# Altium footprint library mylib.PcbLib: 82 footprints (part 3 of 6)
Each footprint in its own frame and in the unit in brackets; x right, y up, seen from the top. Pads: shape width x height; smd on the part's side, far side on the other; paste and mask are expansions set on the pad; w line width, h text height; cw(c..) or ccw(c..) is an arc to the next point about the centre after c.
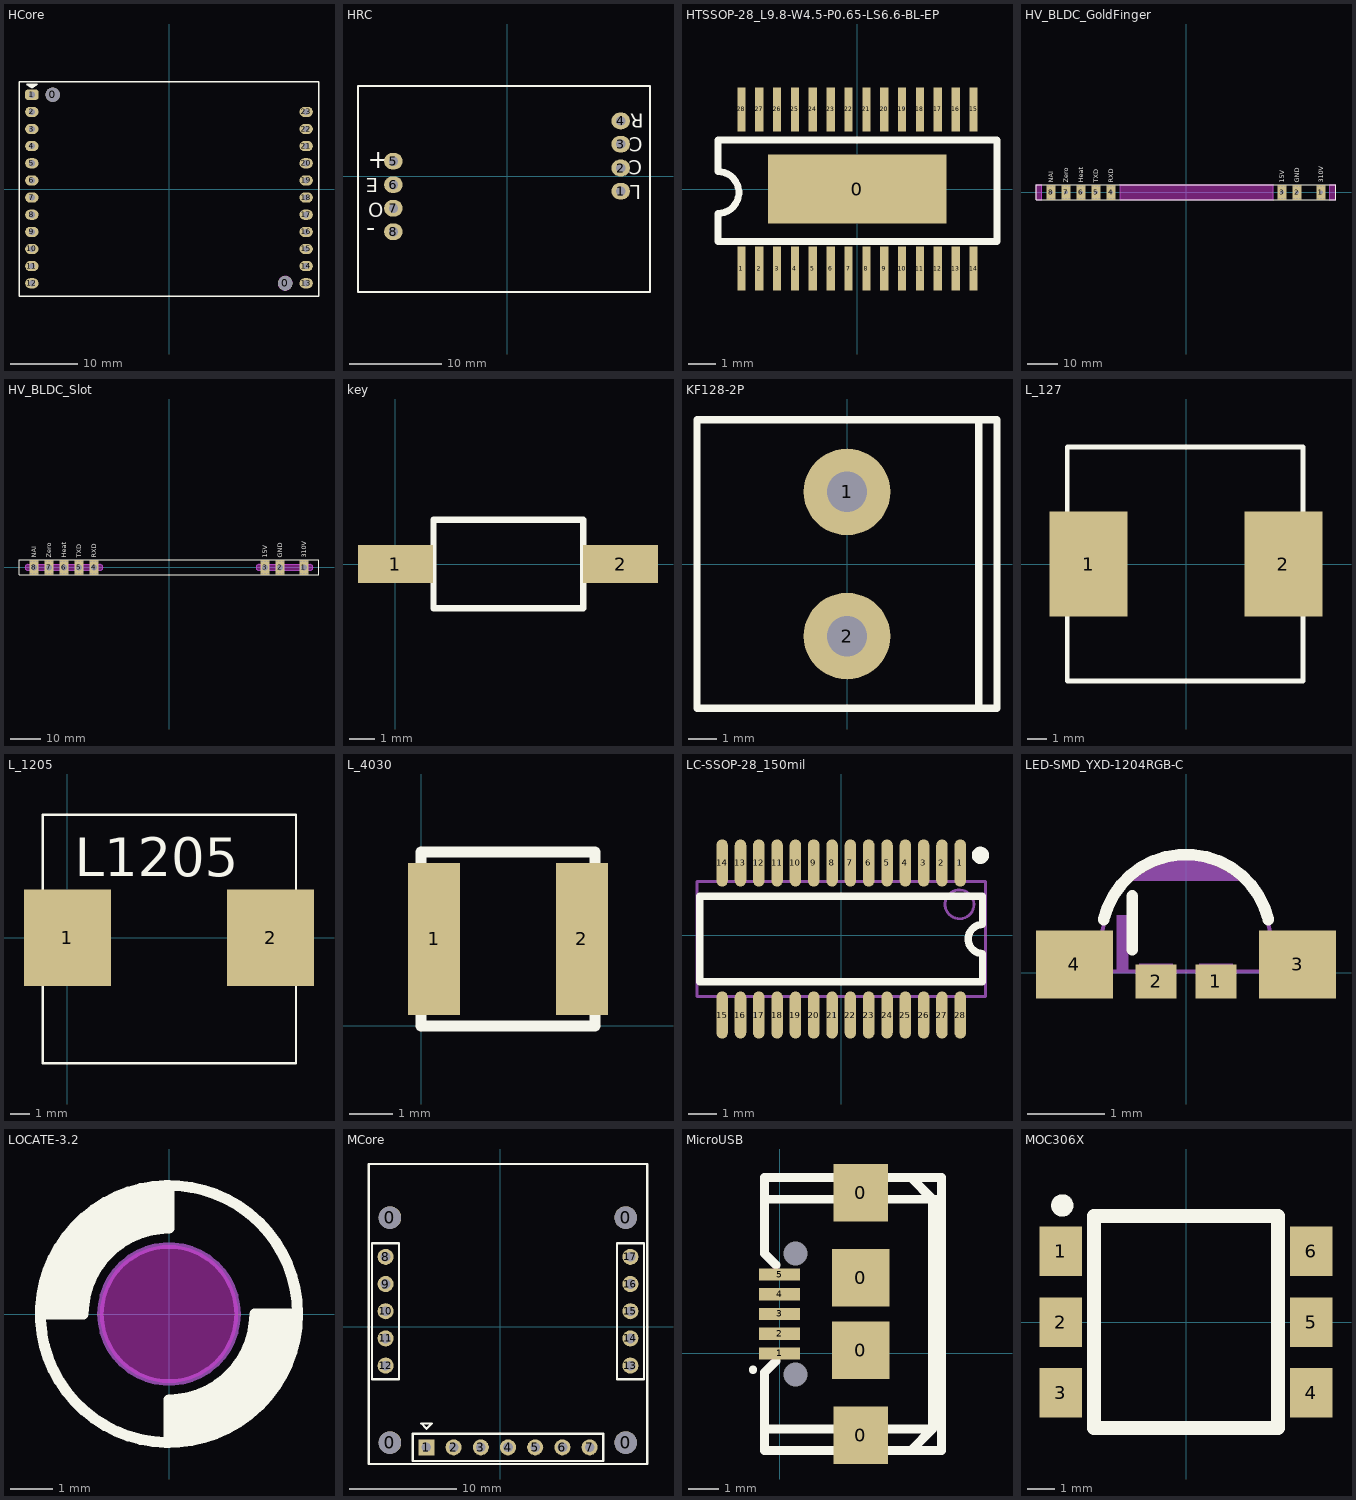
[diagram p2: the footprints below, top view; thin cyan lines are the x and y axes]

## HCore [mm]
pads (25):
  round 2.1 hole 2.1: 0(-17.225,13.97) 0(17.225,-13.97)
  rrect50% 2x1.5 hole 0.9: 1(-20.32,13.97)
  oval 2x1.5 hole 0.9: 2(-20.32,11.43) 3(-20.32,8.89) 4(-20.32,6.35) 5(-20.32,3.81) 6(-20.32,1.27) 7(-20.32,-1.27) 8(-20.32,-3.81) 9(-20.32,-6.35) 10(-20.32,-8.89) 11(-20.32,-11.43) 12(-20.32,-13.97) 13(20.32,-13.97) 14(20.32,-11.43) 15(20.32,-8.89) 16(20.32,-6.35) 17(20.32,-3.81) 18(20.32,-1.27) 19(20.32,1.27) 20(20.32,3.81) 21(20.32,6.35) 22(20.32,8.89) 23(20.32,11.43)
Top Overlay:
  region: -21.082,15.494 -19.558,15.494 -20.32,14.986
  lines w0.2: -22.225,-15.875 -22.225,15.875 22.225,15.875 22.225,-15.875 -22.225,-15.875 ; -21.082,15.494 -20.32,14.986 -19.558,15.494 -21.082,15.494
Keep-Out Layer:
  circle w0.1: c17.225,-13.97 r1.05

## HRC [mm]
pads (8):
  oval 2x1.8 hole 1: 1(12.267,-1.6) 2(12.267,0.9) 3(12.267,3.48) 4(12.267,5.98) 5(-12.267,1.64) 6(-12.267,-0.9) 7(-12.267,-3.44) 8(-12.267,-5.98)
Top Overlay:
  lines w0.2: -16.087,-12.491 -16.087,9.759 15.413,9.759 15.413,-12.491 -16.087,-12.491
  text "R" at 14.763,6.774 h1.52
  text "C" at 14.638,4.224 h1.52
  text "C" at 14.613,1.724 h1.52
  text "L" at 14.488,-0.976 h1.52
  text "+" at -15.027,2.587 h2
  text "E" at -13.887,-0.226 h1.52
  text "O" at -14.987,-2.876 h1.52
  text "-" at -15.211,-4.966 h2

## HTSSOP-28_L9.8-W4.5-P0.65-LS6.6-BL-EP [mm]
pads (29):
  rect 6.5x2.5 smd: 0(0,0)
  rect 0.3x1.6 smd: 1(-4.225,-2.9) 2(-3.575,-2.9) 3(-2.925,-2.9) 4(-2.275,-2.9) 5(-1.625,-2.9) 6(-0.975,-2.9) 7(-0.325,-2.9) 8(0.325,-2.9) 9(0.975,-2.9) 10(1.625,-2.9) 11(2.275,-2.9) 12(2.925,-2.9) 13(3.575,-2.9) 14(4.225,-2.9) 15(4.225,2.9) 16(3.575,2.9) 17(2.925,2.9) 18(2.275,2.9) 19(1.625,2.9) 20(0.975,2.9) 21(0.325,2.9) 22(-0.325,2.9) 23(-0.975,2.9) 24(-1.625,2.9) 25(-2.275,2.9) 26(-2.925,2.9) 27(-3.575,2.9) 28(-4.225,2.9)
Top Overlay:
  lines w0.254: -5.08,-1.905 5.08,-1.905 5.08,1.778 -5.08,1.778 -5.08,0.635 cw(c-5.08,-0.127) -5.08,-0.889 -5.08,-1.905

## HV_BLDC_GoldFinger [mm]
pads (8):
  rect 3x5 hole 1.2: 1(45,0) 2(37,0) 3(32,0) 4(-25,0) 5(-30,0) 6(-35,0) 7(-40,0) 8(-45,0)
via -46,-2 diameter 0.5 hole 0.3
via -45,-2 diameter 0.5 hole 0.3
via -44,-2 diameter 0.5 hole 0.3
via -44,2 diameter 0.5 hole 0.3
via -45,2 diameter 0.5 hole 0.3
via -46,2 diameter 0.5 hole 0.3
via -41,-2 diameter 0.5 hole 0.3
via -40,-2 diameter 0.5 hole 0.3
via -39,-2 diameter 0.5 hole 0.3
via -39,2 diameter 0.5 hole 0.3
via -40,2 diameter 0.5 hole 0.3
via -41,2 diameter 0.5 hole 0.3
via -36,-2 diameter 0.5 hole 0.3
via -35,-2 diameter 0.5 hole 0.3
via -34,-2 diameter 0.5 hole 0.3
via -34,2 diameter 0.5 hole 0.3
via -35,2 diameter 0.5 hole 0.3
via -36,2 diameter 0.5 hole 0.3
via -31,-2 diameter 0.5 hole 0.3
via -30,-2 diameter 0.5 hole 0.3
via -29,-2 diameter 0.5 hole 0.3
via -29,2 diameter 0.5 hole 0.3
via -30,2 diameter 0.5 hole 0.3
via -31,2 diameter 0.5 hole 0.3
via -26,-2 diameter 0.5 hole 0.3
via -25,-2 diameter 0.5 hole 0.3
via -24,-2 diameter 0.5 hole 0.3
via -24,2 diameter 0.5 hole 0.3
via -25,2 diameter 0.5 hole 0.3
via -26,2 diameter 0.5 hole 0.3
via 31,-2 diameter 0.5 hole 0.3
via 32,-2 diameter 0.5 hole 0.3
via 33,-2 diameter 0.5 hole 0.3
via 33,2 diameter 0.5 hole 0.3
via 32,2 diameter 0.5 hole 0.3
via 31,2 diameter 0.5 hole 0.3
via 36,-2 diameter 0.5 hole 0.3
via 37,-2 diameter 0.5 hole 0.3
via 38,-2 diameter 0.5 hole 0.3
via 38,2 diameter 0.5 hole 0.3
via 37,2 diameter 0.5 hole 0.3
via 36,2 diameter 0.5 hole 0.3
via 44,-2 diameter 0.5 hole 0.3
via 45,-2 diameter 0.5 hole 0.3
via 46,-2 diameter 0.5 hole 0.3
via 46,2 diameter 0.5 hole 0.3
via 45,2 diameter 0.5 hole 0.3
via 44,2 diameter 0.5 hole 0.3
Top Overlay:
  lines w0.254: -50,2.5 50,2.5 50,-2.5 -50,-2.5 -50,2.5
  text "310V" at 45.746,3.254 h1.52
  text "TXD" at -29.254,3.254 h1.52
  text "NAI" at -44.254,3.254 h1.52
  text "Heat" at -34.254,3.254 h1.52
  text "Zero" at -39.254,3.254 h1.52
  text "RXD" at -24.254,3.254 h1.52
  text "15V" at 32.746,3.254 h1.52
  text "GND" at 37.746,3.254 h1.52
Keep-Out Layer:
  board cut-out: 48,-2.5 48,2.5 50,2.5 50,-2.5
  board cut-out: -22,-2.5 29,-2.5 29,2.5 -22,2.5
  board cut-out: -50,-2.5 -48,-2.5 -48,2.5 -50,2.5
Mechanical 1:
  lines w0.1: -50,-2.5 -48,-2.5 -48,2.5 -50,2.5 -50,-2.5 ; -22,-2.5 29,-2.5 29,2.5 -22,2.5 -22,-2.5 ; 48,-2.5 50,-2.5 50,2.5 48,2.5 48,-2.5

## HV_BLDC_Slot [mm]
pads (56):
  round 0.5 hole 0.3: 1(44,-2) 1(44,2) 1(45,-2) 1(45,2) 1(46,-2) 1(46,2) 2(36,-2) 2(36,2) 2(37,-2) 2(37,2) 2(38,-2) 2(38,2) 3(31,-2) 3(31,2) 3(32,-2) 3(32,2) 3(33,-2) 3(33,2) 4(-26,-2) 4(-26,2) 4(-25,-2) 4(-25,2) 4(-24,-2) 4(-24,2) 5(-31,-2) 5(-31,2) 5(-30,-2) 5(-30,2) 5(-29,-2) 5(-29,2) 6(-36,-2) 6(-36,2) 6(-35,-2) 6(-35,2) 6(-34,-2) 6(-34,2) 7(-41,-2) 7(-41,2) 7(-40,-2) 7(-40,2) 7(-39,-2) 7(-39,2) 8(-46,-2) 8(-46,2) 8(-45,-2) 8(-45,2) 8(-44,-2) 8(-44,2)
  rect 3x5 hole 2 square: 1(45,0) 2(37,0) 3(32,0) 4(-25,0) 5(-30,0) 6(-35,0) 7(-40,0) 8(-45,0)
Top Overlay:
  lines w0.254: -50,2.5 50,2.5 50,-2.5 -50,-2.5 -50,2.5
  text "GND" at 37.746,3.254 h1.52
  text "RXD" at -24.254,3.254 h1.52
  text "Zero" at -39.254,3.254 h1.52
  text "Heat" at -34.254,3.254 h1.52
  text "NAI" at -44.254,3.254 h1.52
  text "TXD" at -29.254,3.254 h1.52
  text "310V" at 45.746,3.254 h1.52
  text "15V" at 32.746,3.254 h1.52
Keep-Out Layer:
  board cut-out: -47,-1 -23,-1 -22.868,-1 -22.614,-0.932 -22.386,-0.8 -22.2,-0.614 -22.068,-0.386 -22,-0.132 -22,0.132 -22.068,0.386 -22.2,0.614 -22.386,0.8 -22.614,0.932 -22.868,1 -23,1 -47,1 -47.132,1 -47.386,0.932 -47.614,0.8 -47.8,0.614 -47.932,0.386 -48,0.132 -48,-0.132 -47.932,-0.386 -47.8,-0.614 -47.614,-0.8 -47.386,-0.932 -47.132,-1
  board cut-out: 30,-1 47,-1 47.132,-1 47.386,-0.932 47.614,-0.8 47.8,-0.614 47.932,-0.386 48,-0.132 48,0.132 47.932,0.386 47.8,0.614 47.614,0.8 47.386,0.932 47.132,1 47,1 30,1 29.868,1 29.614,0.932 29.386,0.8 29.2,0.614 29.068,0.386 29,0.132 29,-0.132 29.068,-0.386 29.2,-0.614 29.386,-0.8 29.614,-0.932 29.868,-1
Mechanical 1:
  lines w0.1: -47,-1 cw(c-47,0) -47,1 -23,1 cw(c-23,0) -23,-1 -47,-1 ; 30,-1 cw(c30,0) 30,1 47,1 cw(c47,0) 47,-1 30,-1
3D body: height 25, standoff 0, extent -65,-2 65,2

## key [mil]
height 196.85
pads (2):
  rect 118.11x60 smd: 1(0,0) 2(355,0)
Top Overlay:
  lines w10: 60,-70 60,70 296.22,70 296.22,-70 60,-70

## KF128-2P [mm]
pads (2):
  round 3 hole 1.4: 1(0,2.5) 2(0,-2.5)
Top Overlay:
  lines w0.254: 4.572,-4.953 4.572,4.953 ; -5.2,-5 5.2,-5 5.2,5 -5.2,5 -5.2,-5

## L_127 [mm]
pads (2):
  rect 4x5.4 smd: 1(-5,0) 2(5,0)
Top Overlay:
  lines w0.254: -6.096,-6 6,-6 6,6 -6.096,6 -6.096,-6

## L_1205 [mm]
height 5
pads (2):
  rect 4.5x5 smd: 1(0,0) 2(10.5,0)
Top Overlay:
  lines w0.127: -1.27,-6.477 11.811,-6.477 11.811,6.35 -1.27,6.35 -1.27,-6.4
  text "L1205" at 0.381,3.175 h2
3D body: height 5, standoff 0.1, extent -1.27,-6.477 11.811,6.35

## L_4030 [mm]
pads (2):
  rect 1.2x3.5 smd: 1(0.3,2) 2(3.7,2)
Top Overlay:
  lines w0.254: 0,0 4,0 4,4 0,4 0,0

## LC-SSOP-28_150mil [mm]
height 1
pads (28):
  oval 0.4x1.63 smd mask+0.051: 1(4.127,2.508) 2(3.492,2.508) 3(2.857,2.508) 4(2.222,2.508) 5(1.587,2.508) 6(0.953,2.508) 7(0.318,2.508) 8(-0.318,2.508) 9(-0.953,2.508) 10(-1.587,2.508) 11(-2.222,2.508) 12(-2.857,2.508) 13(-3.492,2.508) 14(-4.127,2.508) 15(-4.127,-2.762) 16(-3.492,-2.762) 17(-2.857,-2.762) 18(-2.222,-2.762) 19(-1.587,-2.762) 20(-0.953,-2.762) 21(-0.318,-2.762) 22(0.318,-2.762) 23(0.953,-2.762) 24(1.587,-2.762) 25(2.222,-2.762) 26(2.857,-2.762) 27(3.492,-2.762) 28(4.127,-2.762)
Top Overlay:
  circle w0.3: c4.825,2.773 r0.15
  lines w0.254: -4.9,-1.607 -4.9,1.353 4.9,1.353 4.9,0.373 ccw(c4.9,-0.127) 4.9,-0.627 4.9,-1.607 -4.9,-1.607
Mechanical 13:
  circle w0.1: c4.1,1.073 r0.5
  lines w0.1: -5,-2.127 -5,1.873 5,1.873 5,-2.127 -5,-2.127
3D body: height 0.25, standoff 0, extent -5.08,-2.159 5.08,1.905

## LED-SMD_YXD-1204RGB-C [mm]
pads (4):
  rect 0.53x0.44 smd paste+0 mask+0.05: 1(0.39,-0.11) 2(-0.39,-0.11)
  rect 1x0.88 smd paste+0 mask+0.05: 3(1.45,0.11) 4(-1.45,0.11)
Top Overlay:
  lines w0.152: -1.071,0.693 cw(c0,0.441) 1.071,0.693 ; -0.7,0.3 -0.7,1
Mechanical 6:
  region: 0.7,1.2 0.683,1.217 0.616,1.284 0.457,1.39 0.282,1.463 0.095,1.5 0,1.5 -0.095,1.5 -0.282,1.463 -0.457,1.39 -0.616,1.284 -0.683,1.217 -0.7,1.2
  region: 0.255,-0.15 0.605,-0.15 0.605,-0.25 0.255,-0.25
  region: -0.525,-0.15 -0.175,-0.15 -0.175,-0.25 -0.525,-0.25
  region: 1.2,0.1 1.85,0.1 1.85,-0.05 1.2,-0.05
  region: 1.45,-0.3 1.45,0.35 1.6,0.35 1.6,-0.3
  region: -1.875,0.025 -1.225,0.025 -1.225,-0.125 -1.875,-0.125
  region: -0.9,0.75 -0.9,0 -0.75,0 -0.75,0.75
Mechanical 15:
  region: 0.175,0.12 0.605,0.12 0.605,0.02 0.175,0.02
  region: -0.605,0.12 -0.175,0.12 -0.175,0.02 -0.605,0.02
  region: 1,0.5 1.6,0.5 1.6,0.02 1,0.02
  region: -1.6,0.5 -1,0.5 -1,0.02 -1.6,0.02
  region: 1.66,0.02 1.66,0.045 1.625,0.08 1.575,0.08 1.54,0.045 1.54,0.02 1.54,-0.005 1.575,-0.04 1.625,-0.04 1.66,-0.005
  lines w0.051: -1.6,0.02 -1.6,0.5 -1.1,0.5 -1.01,0.87 -0.84,1.15 -0.63,1.33 -0.41,1.47 -0.16,1.52 0,1.52 0.24,1.51 0.49,1.42 0.72,1.27 0.89,1.09 1.02,0.88 1.1,0.5 1.6,0.5 1.6,0.02 -1.6,0.02
3D body "3D_PCB1_2023-10-13.step": height 2.61, standoff 1.6, extent -1.6,-0.325 1.6,1.176

## LOCATE-3.2 [mm]
Top Overlay:
  circle w0.254: c0,0 r3
  lines w0.254: -3,0 -2,0 cw(c0,0) 0,2 0,3 ; -2.8,0 cw(c0,0) 0,2.8 ; -2.6,0 cw(c0,0) 0,2.6 ; -2.4,0 cw(c0,0) 0,2.4 ; -2.2,0 cw(c0,0) 0,2.2 ; 0,-3.002 0,-2 ccw(c0,0) 2,0 3,0 ; 0,-2.8 ccw(c0,0) 2.8,0 ; 0,-2.6 ccw(c0,0) 2.6,0 ; 0,-2.4 ccw(c0,0) 2.4,0 ; 0,-2.2 ccw(c0,0) 2.2,0
Keep-Out Layer:
  board cut-out: -1.6,0 -1.6,-0.158 -1.538,-0.467 -1.418,-0.758 -1.243,-1.02 -1.02,-1.243 -0.758,-1.418 -0.467,-1.538 -0.158,-1.6 0,-1.6 0.158,-1.6 0.467,-1.538 0.758,-1.418 1.02,-1.243 1.243,-1.02 1.418,-0.758 1.538,-0.467 1.6,-0.158 1.6,0 1.6,0.158 1.539,0.467 1.418,0.758 1.243,1.02 1.02,1.243 0.758,1.418 0.467,1.539 0.158,1.6 0,1.6 -0.158,1.6 -0.467,1.538 -0.758,1.418 -1.02,1.243 -1.243,1.02 -1.418,0.758 -1.538,0.467 -1.6,0.158
Mechanical 1:
  circle w0.152: c0,0 r1.6
Multi-Layer:
  pour cut-out: 0,-3.5 0.229,-3.5 0.684,-3.44 1.127,-3.321 1.551,-3.146 1.949,-2.916 2.313,-2.637 2.637,-2.313 2.916,-1.949 3.146,-1.551 3.321,-1.127 3.44,-0.684 3.5,-0.229 3.5,0 3.5,0.229 3.44,0.684 3.321,1.127 3.146,1.551 2.916,1.949 2.637,2.313 2.313,2.637 1.949,2.916 1.551,3.146 1.127,3.321 0.684,3.44 0.229,3.5 0,3.5 -0.229,3.5 -0.684,3.44 -1.127,3.321 -1.551,3.146 -1.949,2.916 -2.313,2.637 -2.637,2.313 -2.916,1.949 -3.146,1.551 -3.321,1.127 -3.44,0.684 -3.5,0.229 -3.5,0 -3.5,-0.229 -3.44,-0.684 -3.321,-1.127 -3.146,-1.551 -2.916,-1.949 -2.637,-2.313 -2.313,-2.637 -1.949,-2.916 -1.551,-3.146 -1.127,-3.321 -0.684,-3.44 -0.229,-3.5

## MCore [mm]
pads (21):
  round 2.1 hole 2.1 unplated: 0(-10.268,-10.807) 0(-10.268,10.193) 0(11.732,-10.807) 0(11.732,10.193)
  rect 1.5x1.5 hole 0.9: 1(-6.874,-11.252)
  round 1.5 hole 0.9: 2(-4.334,-11.252) 3(-1.794,-11.252) 4(0.746,-11.252) 5(3.286,-11.252) 6(5.826,-11.252) 7(8.366,-11.252) 8(-10.683,6.528) 9(-10.683,3.988) 10(-10.683,1.448) 11(-10.683,-1.092) 12(-10.683,-3.632) 13(12.177,-3.632) 14(12.177,-1.092) 15(12.177,1.448) 16(12.177,3.988) 17(12.177,6.528)
Top Overlay:
  lines w0.2: -12.253,-12.811 -12.253,15.189 ; -12.243,-12.811 13.732,-12.811 ; -12.243,15.189 13.736,15.189 ; 13.746,-12.807 13.746,15.189 ; -11.953,-4.902 -11.953,7.798 -9.413,7.798 -9.413,-4.902 -11.953,-4.902 ; -8.144,-12.522 -8.144,-9.982 9.636,-9.982 9.636,-12.522 -8.144,-12.522 ; -7.366,-9.017 -6.35,-9.017 -6.858,-9.525 -7.366,-9.017 ; 10.907,-4.902 10.907,7.798 13.447,7.798 13.447,-4.902 10.907,-4.902
Keep-Out Layer:
  lines w0.127: 13.732,-12.791 13.736,-12.787

## MicroUSB [mm] "Connector; USB1.1, Type B, SM; 4 Position; Right Angle"
height 11
pads (11):
  rect 1.8x1.9 smd: 0(2.675,-2.7) 0(2.675,5.3)
  rect 1.9x1.9 smd: 0(2.675,0.1) 0(2.675,2.5)
  rect 1.35x0.4 smd mask+0.001: 1(0,0) 2(0,0.65) 3(0,1.3) 4(0,1.95) 5(0,2.6)
  round 0 hole 0.8 unplated mask+0.001: MH1(0.525,3.3) MH2(0.525,-0.7)
Top Overlay:
  circle w0.25: c-0.881,-0.542 r0.011
  lines w0.3: -0.452,-2.495 5.04,-2.495 ; -0.452,5.094 5.334,5.08 5.04,5.094 ; -0.127,-0.254 -0.5,-0.627 -0.5,-3.209 4.326,-3.209 5.04,-2.495 ; -0.127,2.921 -0.5,3.294 -0.5,5.808 4.326,5.808 5.04,5.094 ; 3.818,5.808 5.334,5.808 5.334,-3.209 3.945,-3.209 ; 5.04,-2.495 5.04,5.094
3D body "AP2014.STEP": height 2.79, standoff -0.28, extent -0.11,-3.091 5.515,5.709

## MOC306X [mm]
pads (6):
  rect 1.52x1.78 smd: 1(-4.5,2.54) 2(-4.5,0) 3(-4.5,-2.54) 4(4.5,-2.54) 5(4.5,0) 6(4.5,2.54)
Top Overlay:
  circle w0.4: c-4.445,4.191 r0.2
  lines w0.508: -3.3,-3.81 3.3,-3.81 3.3,3.81 -3.3,3.81 -3.3,-3.81